# Altium integrated library LEMO Unipole And Multipole Type Connectors.IntLib: 1566 symbols (part 1 of 13)
Pins are listed as number, name and electrical type; pins without a type are passive.

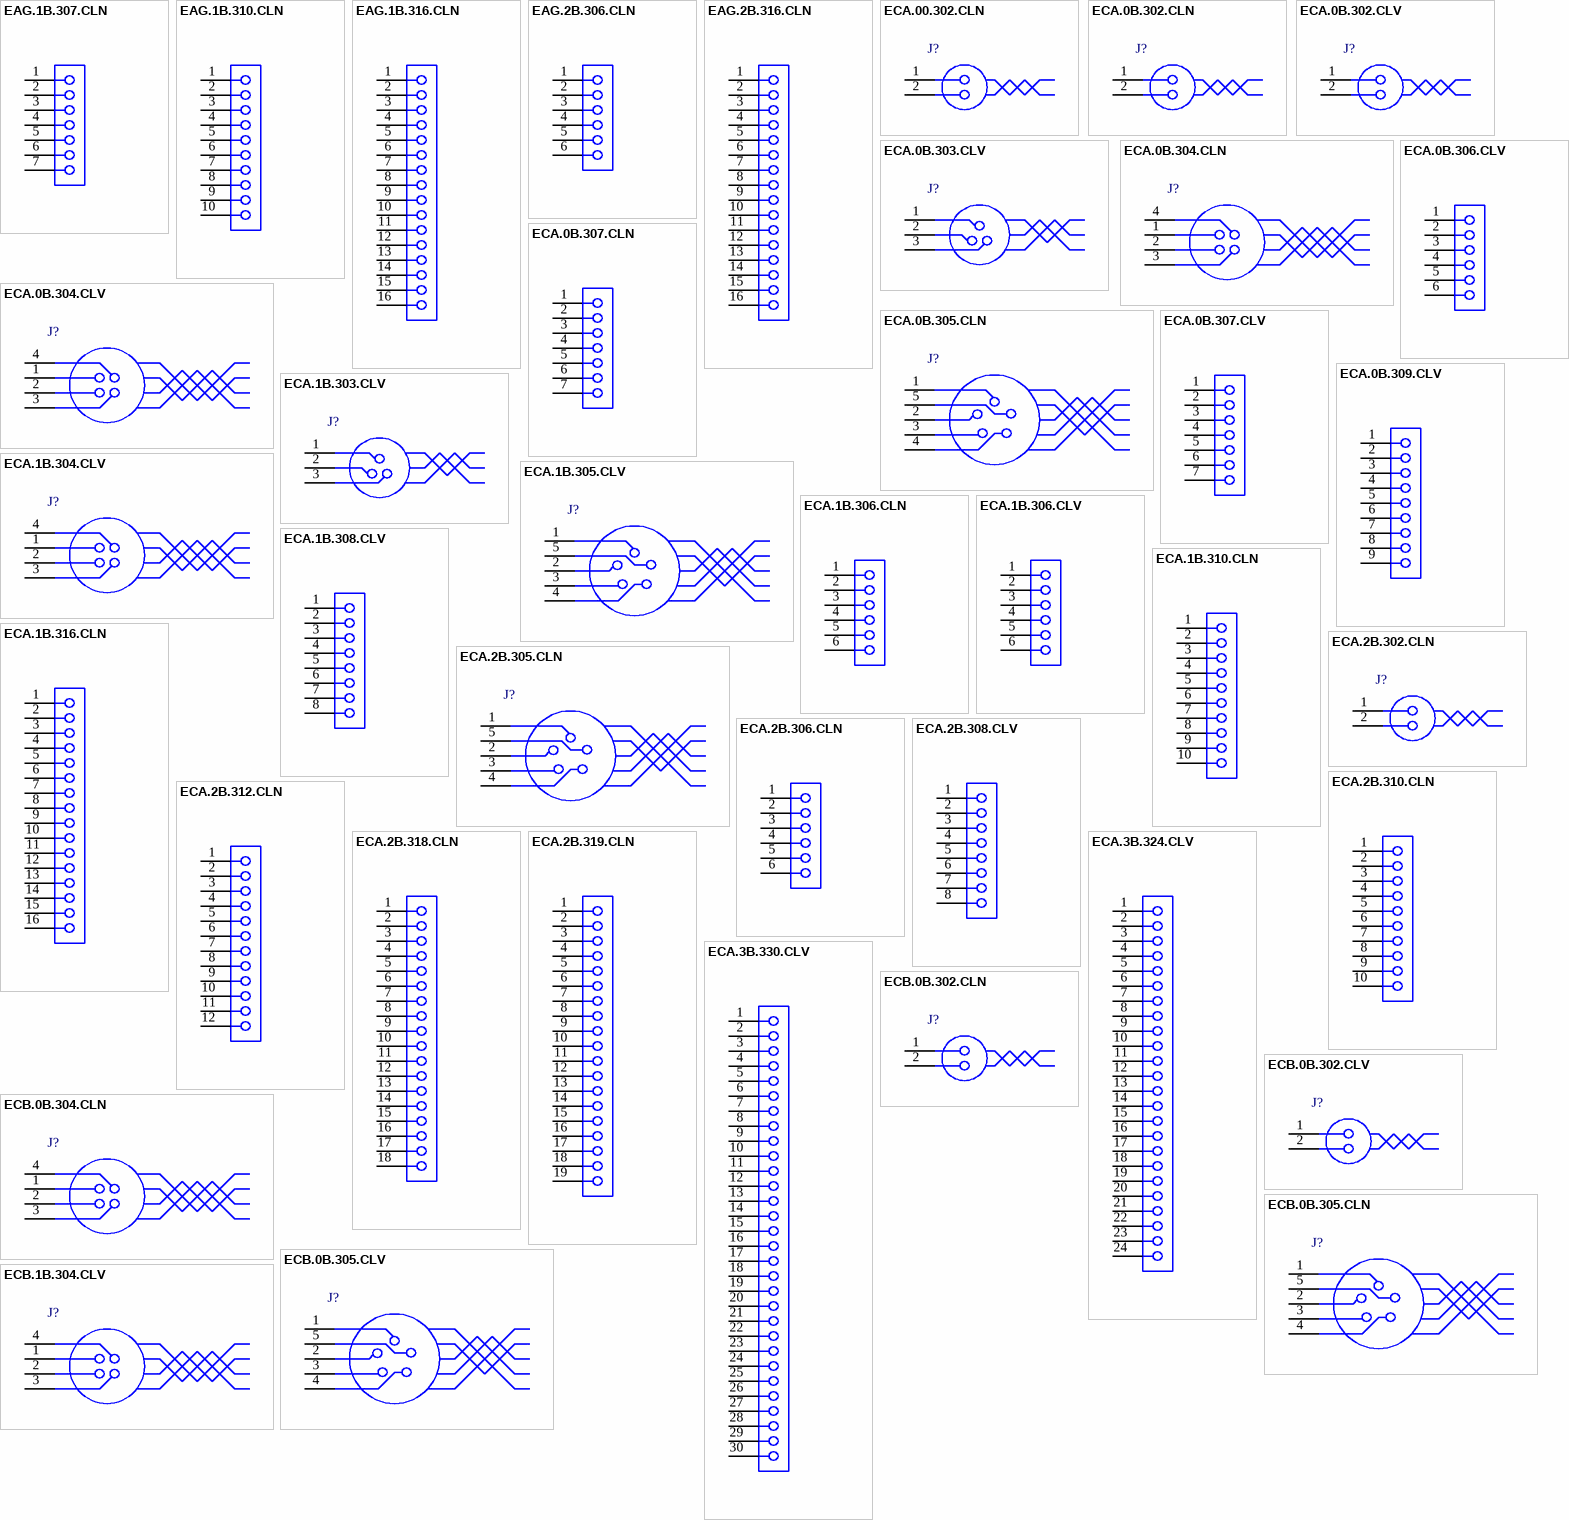
[diagram p0: symbols EAG.1B.307.CLN to ECB.1B.304.CLV]

## EAG.1B.307.CLN
designator J?
Fixed receptacle with one nuts (back panel mounting), Key (G), 1B series, Multipole Type with 7 Contacts; Manufacturer: LEMO; PartNumber: EAG.1B.307.CLN; Number of contacts: 7; Contact Diameter: 0.7 mm; AWG: 24; DatasheetVersion: Jun-14; PackageReference: EAG.1B.307.CLN; PackageDescription: Fixed receptacle with one nuts (back panel mounting), Key(G) for Printed Circuit; Rated Current(A): 7; ComponentLink1Description: Manufacturer URL; ComponentLink1URL: http://www.lemo.com; ComponentLink2Description: Datasheet; ComponentLink2URL: http://intra.lemo.ch/catalog/ROW/UK_English/unipole_multipole.pdf
footprint EAG.1B.307.CLN (Socket, Female, Through Hole)
pins: 1, 2, 3, 4, 5, 6, 7

## EAG.1B.310.CLN
designator J?
Fixed receptacle with one nuts (back panel mounting), Key (G), 1B series, Multipole Type with 10 Contacts; Manufacturer: LEMO; PartNumber: EAG.1B.310.CLN; Number of contacts: 10; Contact Diameter: 0.5 mm; AWG: 28; Rated Current(A): 2.5; DatasheetVersion: Jun-14; PackageReference: EAG.1B.310.CLN; PackageDescription: Fixed receptacle with one nuts (back panel mounting), Key(G) for Printed Circuit; ComponentLink1Description: Manufacturer URL; ComponentLink1URL: http://www.lemo.com; ComponentLink2Description: Datasheet; ComponentLink2URL: http://intra.lemo.ch/catalog/ROW/UK_English/unipole_multipole.pdf
footprint EAG.1B.310.CLN (Socket, Female, Through Hole)
pins: 1, 2, 3, 4, 5, 6, 7, 8, 9, 10

## EAG.1B.316.CLN
designator J?
Fixed receptacle with one nuts (back panel mounting), Key (G), 1B series, Multipole Type with 16 Contacts; Manufacturer: LEMO; PartNumber: EAG.1B.316.CLN; Number of contacts: 16; Contact Diameter: 0.5 mm; AWG: 28; Rated Current(A): 1.5; DatasheetVersion: Jun-14; PackageReference: EAG.1B.316.CLN; PackageDescription: Fixed receptacle with one nuts (back panel mounting), Key(G) for Printed Circuit; ComponentLink1Description: Manufacturer URL; ComponentLink1URL: http://www.lemo.com; ComponentLink2Description: Datasheet; ComponentLink2URL: http://intra.lemo.ch/catalog/ROW/UK_English/unipole_multipole.pdf
footprint EAG.1B.316.CLN (Socket, Female, Through Hole)
pins: 1, 2, 3, 4, 5, 6, 7, 8, 9, 10, 11, 12, 13, 14, 15, 16

## EAG.2B.306.CLN
designator J?
Fixed receptacle with one nuts (back panel mounting), Key (G), 2B series, Multipole Type with 6 Contacts; Manufacturer: LEMO; PartNumber: EAG.2B.306.CLN; Number of contacts: 6; Contact Diameter: 1.3 mm; AWG: 20; Rated Current(A): 12; DatasheetVersion: Jun-14; PackageReference: EAG.2B.306.CLN; PackageDescription: Fixed receptacle with one nuts (back panel mounting), Key(G) for Printed Circuit; ComponentLink1Description: Manufacturer URL; ComponentLink1URL: http://www.lemo.com; ComponentLink2Description: Datasheet; ComponentLink2URL: http://intra.lemo.ch/catalog/ROW/UK_English/unipole_multipole.pdf
footprint EAG.2B.306.CLN (Socket, Female, Through Hole)
pins: 1, 2, 3, 4, 5, 6

## EAG.2B.316.CLN
designator J?
Fixed receptacle with one nuts (back panel mounting), Key (G), 2B series, Multipole Type with 16 Contacts; Manufacturer: LEMO; PartNumber: EAG.2B.316.CLN; Number of contacts: 16; Contact Diameter: 0.7 mm; AWG: 24; Rated Current(A): 6; DatasheetVersion: Jun-14; PackageReference: EAG.2B.316.CLN; PackageDescription: Fixed receptacle with one nuts (back panel mounting), Key(G) for Printed Circuit; ComponentLink1Description: Manufacturer URL; ComponentLink1URL: http://www.lemo.com; ComponentLink2Description: Datasheet; ComponentLink2URL: http://intra.lemo.ch/catalog/ROW/UK_English/unipole_multipole.pdf
footprint EAG.2B.316.CLN (Socket, Female, Through Hole)
pins: 1, 2, 3, 4, 5, 6, 7, 8, 9, 10, 11, 12, 13, 14, 15, 16

## ECA.00.302.CLN
designator J?
Fixed receptacle with two nuts and straight contact for printed circuit (back panel mounting), Key (A), 00 series, Multipole Type with 2 Contacts; Manufacturer: LEMO; PartNumber: ECA.00.302.CLN; Number of contacts: 2; Contact Diameter: 0.5 mm; AWG: 28; Rated Current(A): 5; DatasheetVersion: Jun-14; PackageReference: ECA.00.302.CLN; PackageDescription: Fixed receptacle with two nuts and straight contact for printed circuit (back panel mounting), Key(A) for Printed Circuit; Supplier 1: Mouser; Supplier Part Number 1: N/A; ComponentLink1Description: Manufacturer URL; ComponentLink1URL: http://www.lemo.com; ComponentLink2Description: Datasheet; ComponentLink2URL: http://intra.lemo.ch/catalog/ROW/UK_English/unipole_multipole.pdf
footprint ECA.00.302.CLN (Socket, Female, Through Hole)
pins: 1, 2

## ECA.0B.302.CLN
designator J?
Fixed receptacle with two nuts and straight contact for printed circuit (back panel mounting), Key (A), 0B series, Multipole Type with 2 Contacts; Manufacturer: LEMO; PartNumber: ECA.0B.302.CLN; Number of contacts: 2; Contact Diameter: 0.9 mm; AWG: 22; Rated Current(A): 10; DatasheetVersion: Jun-14; PackageReference: ECA.0B.302.CLN; PackageDescription: Fixed receptacle with two nuts and straight contact for printed circuit (back panel mounting), Key(A) for Printed Circuit; ComponentLink1Description: Manufacturer URL; ComponentLink1URL: http://www.lemo.com; ComponentLink2Description: Datasheet; ComponentLink2URL: http://intra.lemo.ch/catalog/ROW/UK_English/unipole_multipole.pdf
footprint ECA.0B.302.CLN (Socket, Female, Body 9mm dia. Height 16.4 mm, Through hole)
pins: 1, 2

## ECA.0B.302.CLV
designator J?
Fixed receptacle with two nuts, with elbow contact for printed circuit (back panel mounting), Key (A), 0B series, Multipole Type with 2 Contacts; Manufacturer: LEMO; PartNumber: ECA.0B.302.CLV; Number of contacts: 2; Contact Diameter: 0.9 mm; AWG: 22; Rated Current(A): 6; DatasheetVersion: Jun-14; PackageReference: ECA.0B.302.CLV; PackageDescription: Fixed receptacle with two nuts, with elbow contact for printed circuit (back panel mounting), Key(A) for Printed Circuit; ComponentLink1Description: Manufacturer URL; ComponentLink1URL: http://www.lemo.com; ComponentLink2Description: Datasheet; ComponentLink2URL: http://intra.lemo.ch/catalog/ROW/UK_English/unipole_multipole.pdf
footprint ECA.0B.302.CLV (Socket, Female, Body 9mm dia. Height 18.3 mm, Through hole)
pins: 1, 2

## ECA.0B.303.CLV
designator J?
Fixed receptacle with two nuts, with elbow contact for printed circuit (back panel mounting), Key (A), 0B series, Multipole Type with 3 Contacts; Manufacturer: LEMO; PartNumber: ECA.0B.303.CLV; Number of contacts: 3; Contact Diameter: 0.9 mm; AWG: 22; Rated Current(A): 6; DatasheetVersion: Jun-14; PackageReference: ECA.0B.303.CLV; PackageDescription: Fixed receptacle with two nuts, with elbow contact for printed circuit (back panel mounting), Key(A) for Printed Circuit; ComponentLink1Description: Manufacturer URL; ComponentLink1URL: http://www.lemo.com; ComponentLink2Description: Datasheet; ComponentLink2URL: http://intra.lemo.ch/catalog/ROW/UK_English/unipole_multipole.pdf
footprint ECA.0B.303.CLV (Socket, Female, Body 9mm dia. Height 18.3 mm, Through hole)
pins: 1, 2, 3

## ECA.0B.304.CLN
designator J?
Fixed receptacle with two nuts and straight contact for printed circuit (back panel mounting), Key (A), 0B series, Multipole Type with 4 Contacts; Manufacturer: LEMO; PartNumber: ECA.0B.304.CLN; Number of contacts: 4; Contact Diameter: 0.7 mm; AWG: 24; Rated Current(A): 7; DatasheetVersion: Jun-14; PackageReference: ECA.0B.304.CLN; PackageDescription: Fixed receptacle with two nuts and straight contact for printed circuit (back panel mounting), Key(A) for Printed Circuit; ComponentLink1Description: Manufacturer URL; ComponentLink1URL: http://www.lemo.com; ComponentLink2Description: Datasheet; ComponentLink2URL: http://intra.lemo.ch/catalog/ROW/UK_English/unipole_multipole.pdf
footprint ECA.0B.304.CLN (Socket, Female, Body 9mm dia. Height 16.4 mm, Through hole)
pins: 1, 2, 3, 4

## ECA.0B.304.CLV
designator J?
Fixed receptacle with two nuts, with elbow contact for printed circuit (back panel mounting), Key (A), 0B series, Multipole Type with 4 Contacts; Manufacturer: LEMO; PartNumber: ECA.0B.304.CLV; Number of contacts: 4; Contact Diameter: 0.7 mm; AWG: 24; Rated Current(A): 6; DatasheetVersion: Jun-14; PackageReference: ECA.0B.304.CLV; PackageDescription: Fixed receptacle with two nuts, with elbow contact for printed circuit (back panel mounting), Key(A) for Printed Circuit; Supplier 1: Mouser; Supplier Part Number 1: 736-ECA0B304CLV; Supplier 2: Digi-Key; Supplier Part Number 2: ECA.0B.304.CLV-ND; ComponentLink1Description: Manufacturer URL; ComponentLink1URL: http://www.lemo.com; ComponentLink2Description: Datasheet; ComponentLink2URL: http://intra.lemo.ch/catalog/ROW/UK_English/unipole_multipole.pdf
footprint ECA.0B.304.CLV (Socket, Female, Body 9mm dia. Height 18.3 mm, Through hole)
pins: 1, 2, 3, 4

## ECA.0B.305.CLN
designator J?
Fixed receptacle with two nuts and straight contact for printed circuit (back panel mounting), Key (A), 0B series, Multipole Type with 5 Contacts; Manufacturer: LEMO; PartNumber: ECA.0B.305.CLN; Number of contacts: 5; Contact Diameter: 0.7 mm; AWG: 24; Rated Current(A): 6.5; DatasheetVersion: Jun-14; PackageReference: ECA.0B.305.CLN; PackageDescription: Fixed receptacle with two nuts and straight contact for printed circuit (back panel mounting), Key(A) for Printed Circuit; Supplier 1: Mouser; Supplier Part Number 1: 736-ECA0B305CLN; Supplier 2: Newark; Supplier Part Number 2: 29Y5664; Supplier 3: Digi-Key; Supplier Part Number 3: ECA.0B.305.CLN-ND; ComponentLink1Description: Manufacturer URL; ComponentLink1URL: http://www.lemo.com; ComponentLink2Description: Datasheet; ComponentLink2URL: http://intra.lemo.ch/catalog/ROW/UK_English/unipole_multipole.pdf
footprint ECA.0B.305.CLN (Socket, Female, Body 9mm dia. Height 16.4 mm, Through hole)
pins: 1, 2, 3, 4, 5

## ECA.0B.306.CLV
designator J?
Fixed receptacle with two nuts, with elbow contact for printed circuit (back panel mounting), Key (A), 0B series, Multipole Type with 6 Contacts; Manufacturer: LEMO; PartNumber: ECA.0B.306.CLV; Number of contacts: 6; Contact Diameter: 0.5 mm; AWG: 28; Rated Current(A): 0; DatasheetVersion: Jun-14; PackageReference: ECA.0B.306.CLV; PackageDescription: Fixed receptacle with two nuts, with elbow contact for printed circuit (back panel mounting), Key(A) for Printed Circuit; ComponentLink1Description: Manufacturer URL; ComponentLink1URL: http://www.lemo.com; ComponentLink2Description: Datasheet; ComponentLink2URL: http://intra.lemo.ch/catalog/ROW/UK_English/unipole_multipole.pdf
footprint ECA.0B.306.CLV (Socket, Female, Body 9mm dia. Height 18.3 mm, Through hole)
pins: 1, 2, 3, 4, 5, 6

## ECA.0B.307.CLN
designator J?
Fixed receptacle with two nuts and straight contact for printed circuit (back panel mounting), Key (A), 0B series, Multipole Type with 7 Contacts; Manufacturer: LEMO; PartNumber: ECA.0B.307.CLN; Number of contacts: 7; Contact Diameter: 0.5 mm; AWG: 28; Rated Current(A): 2.5; DatasheetVersion: Jun-14; PackageReference: ECA.0B.307.CLN; PackageDescription: Fixed receptacle with two nuts and straight contact for printed circuit (back panel mounting), Key(A) for Printed Circuit; ComponentLink1Description: Manufacturer URL; ComponentLink1URL: http://www.lemo.com; ComponentLink2Description: Datasheet; ComponentLink2URL: http://intra.lemo.ch/catalog/ROW/UK_English/unipole_multipole.pdf
footprint ECA.0B.307.CLN (Socket, Female, Body 9mm dia. Height 16.4 mm, Through hole)
pins: 1, 2, 3, 4, 5, 6, 7

## ECA.0B.307.CLV
designator J?
Fixed receptacle with two nuts, with elbow contact for printed circuit (back panel mounting), Key (A), 0B series, Multipole Type with 7 Contacts; Manufacturer: LEMO; PartNumber: ECA.0B.307.CLV; Number of contacts: 7; Contact Diameter: 0.5 mm; AWG: 28; Rated Current(A): 0; DatasheetVersion: Jun-14; PackageReference: ECA.0B.307.CLV; PackageDescription: Fixed receptacle with two nuts, with elbow contact for printed circuit (back panel mounting), Key(A) for Printed Circuit; ComponentLink1Description: Manufacturer URL; ComponentLink1URL: http://www.lemo.com; ComponentLink2Description: Datasheet; ComponentLink2URL: http://intra.lemo.ch/catalog/ROW/UK_English/unipole_multipole.pdf
footprint ECA.0B.307.CLV (Socket, Female, Body 9mm dia. Height 18.3 mm, Through hole)
pins: 1, 2, 3, 4, 5, 6, 7

## ECA.0B.309.CLV
designator J?
Fixed receptacle with two nuts, with elbow contact for printed circuit (back panel mounting), Key (A), 0B series, Multipole Type with 9 Contacts; Manufacturer: LEMO; PartNumber: ECA.0B.309.CLV; Number of contacts: 9; Contact Diameter: 0.5 mm; AWG: 28; Rated Current(A): 0; DatasheetVersion: Jun-14; PackageReference: ECA.0B.309.CLV; PackageDescription: Fixed receptacle with two nuts, with elbow contact for printed circuit (back panel mounting), Key(A) for Printed Circuit; ComponentLink1Description: Manufacturer URL; ComponentLink1URL: http://www.lemo.com; ComponentLink2Description: Datasheet; ComponentLink2URL: http://intra.lemo.ch/catalog/ROW/UK_English/unipole_multipole.pdf
footprint ECA.0B.309.CLV (Socket, Female, Body 9mm dia. Height 18.3 mm, Through hole)
pins: 1, 2, 3, 4, 5, 6, 7, 8, 9

## ECA.1B.303.CLV
designator J?
Fixed receptacle with two nuts, with elbow contact for printed circuit (back panel mounting), Key (A), 1B series, Multipole Type with 3 Contacts; Manufacturer: LEMO; PartNumber: ECA.1B.303.CLV; Number of contacts: 3; Contact Diameter: 1.3 mm; AWG: 20; Rated Current(A): 0; DatasheetVersion: Jun-14; PackageReference: ECA.1B.303.CLV; PackageDescription: Fixed receptacle with two nuts, with elbow contact for printed circuit (back panel mounting), Key(A) for Printed Circuit; ComponentLink1Description: Manufacturer URL; ComponentLink1URL: http://www.lemo.com; ComponentLink2Description: Datasheet; ComponentLink2URL: http://intra.lemo.ch/catalog/ROW/UK_English/unipole_multipole.pdf
footprint ECA.1B.303.CLV (Socket, Female, Body 12mm dia. Height 20.3 mm, Through hole)
pins: 1, 2, 3

## ECA.1B.304.CLV
designator J?
Fixed receptacle with two nuts, with elbow contact for printed circuit (back panel mounting), Key (A), 1B series, Multipole Type with 4 Contacts; Manufacturer: LEMO; PartNumber: ECA.1B.304.CLV; Number of contacts: 4; Contact Diameter: 0.9 mm; AWG: 22; Rated Current(A): 6; DatasheetVersion: Jun-14; PackageReference: ECA.1B.304.CLV; PackageDescription: Fixed receptacle with two nuts, with elbow contact for printed circuit (back panel mounting), Key(A) for Printed Circuit; ComponentLink1Description: Manufacturer URL; ComponentLink1URL: http://www.lemo.com; ComponentLink2Description: Datasheet; ComponentLink2URL: http://intra.lemo.ch/catalog/ROW/UK_English/unipole_multipole.pdf
footprint ECA.1B.304.CLV (Socket, Female, Body 12mm dia. Height 20.3 mm, Through hole)
pins: 1, 2, 3, 4

## ECA.1B.305.CLV
designator J?
Fixed receptacle with two nuts, with elbow contact for printed circuit (back panel mounting), Key (A), 1B series, Multipole Type with 5 Contacts; Manufacturer: LEMO; PartNumber: ECA.1B.305.CLV; Number of contacts: 5; Contact Diameter: 0.9 mm; AWG: 22; Rated Current(A): 6; DatasheetVersion: Jun-14; PackageReference: ECA.1B.305.CLV; PackageDescription: Fixed receptacle with two nuts, with elbow contact for printed circuit (back panel mounting), Key(A) for Printed Circuit; ComponentLink1Description: Manufacturer URL; ComponentLink1URL: http://www.lemo.com; ComponentLink2Description: Datasheet; ComponentLink2URL: http://intra.lemo.ch/catalog/ROW/UK_English/unipole_multipole.pdf
footprint ECA.1B.305.CLV (Socket, Female, Body 12mm dia. Height 20.3 mm, Through hole)
pins: 1, 2, 3, 4, 5

## ECA.1B.306.CLN
designator J?
Fixed receptacle with two nuts and straight contact for printed circuit (back panel mounting), Key (A), 1B series, Multipole Type with 6 Contacts; Manufacturer: LEMO; PartNumber: ECA.1B.306.CLN; Number of contacts: 6; Contact Diameter: 0.7 mm; AWG: 24; Rated Current(A): 7; DatasheetVersion: Jun-14; PackageReference: ECA.1B.306.CLN; PackageDescription: Fixed receptacle with two nuts and straight contact for printed circuit (back panel mounting), Key(A) for Printed Circuit; ComponentLink1Description: Manufacturer URL; ComponentLink1URL: http://www.lemo.com; ComponentLink2Description: Datasheet; ComponentLink2URL: http://intra.lemo.ch/catalog/ROW/UK_English/unipole_multipole.pdf
footprint ECA.1B.306.CLN (Socket, Female, Body 12mm dia. Height 19.8 mm, Through hole)
pins: 1, 2, 3, 4, 5, 6

## ECA.1B.306.CLV
designator J?
Fixed receptacle with two nuts, with elbow contact for printed circuit (back panel mounting), Key (A), 1B series, Multipole Type with 6 Contacts; Manufacturer: LEMO; PartNumber: ECA.1B.306.CLV; Number of contacts: 6; Contact Diameter: 0.7 mm; AWG: 24; DatasheetVersion: Jun-14; PackageReference: ECA.1B.306.CLV; PackageDescription: Fixed receptacle with two nuts, with elbow contact for printed circuit (back panel mounting), Key(A) for Printed Circuit; Rated Current(A): 6; ComponentLink1Description: Manufacturer URL; ComponentLink1URL: http://www.lemo.com; ComponentLink2Description: Datasheet; ComponentLink2URL: http://intra.lemo.ch/catalog/ROW/UK_English/unipole_multipole.pdf
footprint ECA.1B.306.CLV (Socket, Female, Body 12mm dia. Height 20.3 mm, Through hole)
pins: 1, 2, 3, 4, 5, 6

## ECA.1B.308.CLV
designator J?
Fixed receptacle with two nuts, with elbow contact for printed circuit (back panel mounting), Key (A), 1B series, Multipole Type with 8 Contacts; Manufacturer: LEMO; PartNumber: ECA.1B.308.CLV; Number of contacts: 8; Contact Diameter: 0.7 mm; AWG: 24; Rated Current(A): 0; DatasheetVersion: Jun-14; PackageReference: ECA.1B.308.CLV; PackageDescription: Fixed receptacle with two nuts, with elbow contact for printed circuit (back panel mounting), Key(A) for Printed Circuit; ComponentLink1Description: Manufacturer URL; ComponentLink1URL: http://www.lemo.com; ComponentLink2Description: Datasheet; ComponentLink2URL: http://intra.lemo.ch/catalog/ROW/UK_English/unipole_multipole.pdf
footprint ECA.1B.308.CLV (Socket, Female, Body 12mm dia. Height 20.3 mm, Through hole)
pins: 1, 2, 3, 4, 5, 6, 7, 8

## ECA.1B.310.CLN
designator J?
Fixed receptacle with two nuts and straight contact for printed circuit (back panel mounting), Key (A), 1B series, Multipole Type with 10 Contacts; Manufacturer: LEMO; PartNumber: ECA.1B.310.CLN; Number of contacts: 10; Contact Diameter: 0.5 mm; AWG: 28; Rated Current(A): 2.5; DatasheetVersion: Jun-14; PackageReference: ECA.1B.310.CLN; PackageDescription: Fixed receptacle with two nuts and straight contact for printed circuit (back panel mounting), Key(A) for Printed Circuit; Supplier 1: Mouser; Supplier Part Number 1: 736-ECA1B310CLN; Supplier 2: Digi-Key; Supplier Part Number 2: ECA.1B.310.CLN-ND; ComponentLink1Description: Manufacturer URL; ComponentLink1URL: http://www.lemo.com; ComponentLink2Description: Datasheet; ComponentLink2URL: http://intra.lemo.ch/catalog/ROW/UK_English/unipole_multipole.pdf
footprint ECA.1B.310.CLN (Socket, Female, Body 12mm dia. Height 19.8 mm, Through hole)
pins: 1, 2, 3, 4, 5, 6, 7, 8, 9, 10

## ECA.1B.316.CLN
designator J?
Fixed receptacle with two nuts and straight contact for printed circuit (back panel mounting), Key (A), 1B series, Multipole Type with 16 Contacts; Manufacturer: LEMO; PartNumber: ECA.1B.316.CLN; Number of contacts: 16; Contact Diameter: 0.5 mm; AWG: 28; Rated Current(A): 1.5; DatasheetVersion: Jun-14; PackageReference: ECA.1B.316.CLN; PackageDescription: Fixed receptacle with two nuts and straight contact for printed circuit (back panel mounting), Key(A) for Printed Circuit; ComponentLink1Description: Manufacturer URL; ComponentLink1URL: http://www.lemo.com; ComponentLink2Description: Datasheet; ComponentLink2URL: http://intra.lemo.ch/catalog/ROW/UK_English/unipole_multipole.pdf
footprint ECA.1B.316.CLN (Socket, Female, Body 12mm dia. Height 19.8 mm, Through hole)
pins: 1, 2, 3, 4, 5, 6, 7, 8, 9, 10, 11, 12, 13, 14, 15, 16

## ECA.2B.302.CLN
designator J?
Fixed receptacle with two nuts and straight contact for printed circuit (back panel mounting), Key (A), 2B series, Multipole Type with 2 Contacts; Manufacturer: LEMO; PartNumber: ECA.2B.302.CLN; Number of contacts: 2; Contact Diameter: 2 mm; AWG: 14; Rated Current(A): 25; DatasheetVersion: Jun-14; PackageReference: ECA.2B.302.CLN; PackageDescription: Fixed receptacle with two nuts and straight contact for printed circuit (back panel mounting), Key(A) for Printed Circuit; Supplier 1: Mouser; Supplier Part Number 1: 736-ECA2B302CLN; Supplier 2: Digi-Key; Supplier Part Number 2: ECA.2B.302.CLN-ND; ComponentLink1Description: Manufacturer URL; ComponentLink1URL: http://www.lemo.com; ComponentLink2Description: Datasheet; ComponentLink2URL: http://intra.lemo.ch/catalog/ROW/UK_English/unipole_multipole.pdf
footprint ECA.2B.302.CLN (Socket, Female, Body 15mm dia. Height 21.8 mm, Through hole)
pins: 1, 2

## ECA.2B.305.CLN
designator J?
Fixed receptacle with two nuts and straight contact for printed circuit (back panel mounting), Key (A), 2B series, Multipole Type with 5 Contacts; Manufacturer: LEMO; PartNumber: ECA.2B.305.CLN; Number of contacts: 5; Contact Diameter: 1.3 mm; AWG: 20; Rated Current(A): 14; DatasheetVersion: Jun-14; PackageReference: ECA.2B.305.CLN; PackageDescription: Fixed receptacle with two nuts and straight contact for printed circuit (back panel mounting), Key(A) for Printed Circuit; ComponentLink1Description: Manufacturer URL; ComponentLink1URL: http://www.lemo.com; ComponentLink2Description: Datasheet; ComponentLink2URL: http://intra.lemo.ch/catalog/ROW/UK_English/unipole_multipole.pdf
footprint ECA.2B.305.CLN (Socket, Female, Body 15mm dia. Height 21.8 mm, Through hole)
pins: 1, 2, 3, 4, 5

## ECA.2B.306.CLN
designator J?
Fixed receptacle with two nuts and straight contact for printed circuit (back panel mounting), Key (A), 2B series, Multipole Type with 6 Contacts; Manufacturer: LEMO; PartNumber: ECA.2B.306.CLN; Number of contacts: 6; Contact Diameter: 1.3 mm; AWG: 20; Rated Current(A): 12; DatasheetVersion: Jun-14; PackageReference: ECA.2B.306.CLN; PackageDescription: Fixed receptacle with two nuts and straight contact for printed circuit (back panel mounting), Key(A) for Printed Circuit; ComponentLink1Description: Manufacturer URL; ComponentLink1URL: http://www.lemo.com; ComponentLink2Description: Datasheet; ComponentLink2URL: http://intra.lemo.ch/catalog/ROW/UK_English/unipole_multipole.pdf
footprint ECA.2B.306.CLN (Socket, Female, Body 15mm dia. Height 21.8 mm, Through hole)
pins: 1, 2, 3, 4, 5, 6

## ECA.2B.308.CLV
designator J?
Fixed receptacle with two nuts, with elbow contact for printed circuit (back panel mounting), Key (A), 2B series, Multipole Type with 8 Contacts; Manufacturer: LEMO; PartNumber: ECA.2B.308.CLV; Number of contacts: 8; Contact Diameter: 0.9 mm; AWG: 22; Rated Current(A): 6; DatasheetVersion: Jun-14; PackageReference: ECA.2B.308.CLV; PackageDescription: Fixed receptacle with two nuts, with elbow contact for printed circuit (back panel mounting), Key(A) for Printed Circuit; ComponentLink1Description: Manufacturer URL; ComponentLink1URL: http://www.lemo.com; ComponentLink2Description: Datasheet; ComponentLink2URL: http://intra.lemo.ch/catalog/ROW/UK_English/unipole_multipole.pdf
footprint ECA.2B.308.CLV (Socket, Female, Body 15mm dia. Height 22.3 mm, Through hole)
pins: 1, 2, 3, 4, 5, 6, 7, 8

## ECA.2B.310.CLN
designator J?
Fixed receptacle with two nuts and straight contact for printed circuit (back panel mounting), Key (A), 2B series, Multipole Type with 10 Contacts; Manufacturer: LEMO; PartNumber: ECA.2B.310.CLN; Number of contacts: 10; Contact Diameter: 0.9 mm; AWG: 22; Rated Current(A): 8; DatasheetVersion: Jun-14; PackageReference: ECA.2B.310.CLN; PackageDescription: Fixed receptacle with two nuts and straight contact for printed circuit (back panel mounting), Key(A) for Printed Circuit; Supplier 1: Mouser; Supplier Part Number 1: 736-ECA2B310CLN; Supplier 2: Digi-Key; Supplier Part Number 2: ECA.2B.310.CLN-ND; ComponentLink1Description: Manufacturer URL; ComponentLink1URL: http://www.lemo.com; ComponentLink2Description: Datasheet; ComponentLink2URL: http://intra.lemo.ch/catalog/ROW/UK_English/unipole_multipole.pdf
footprint ECA.2B.310.CLN (Socket, Female, Body 15mm dia. Height 21.8 mm, Through hole)
pins: 1, 2, 3, 4, 5, 6, 7, 8, 9, 10

## ECA.2B.312.CLN
designator J?
Fixed receptacle with two nuts and straight contact for printed circuit (back panel mounting), Key (A), 2B series, Multipole Type with 12 Contacts; Manufacturer: LEMO; PartNumber: ECA.2B.312.CLN; Number of contacts: 12; Contact Diameter: 0.7 mm; AWG: 24; Rated Current(A): 7; DatasheetVersion: Jun-14; PackageReference: ECA.2B.312.CLN; PackageDescription: Fixed receptacle with two nuts and straight contact for printed circuit (back panel mounting), Key(A) for Printed Circuit; Supplier 1: Mouser; Supplier Part Number 1: 736-ECA2B312CLN; Supplier 2: Digi-Key; Supplier Part Number 2: ECA.2B.312.CLN-ND; ComponentLink1Description: Manufacturer URL; ComponentLink1URL: http://www.lemo.com; ComponentLink2Description: Datasheet; ComponentLink2URL: http://intra.lemo.ch/catalog/ROW/UK_English/unipole_multipole.pdf
footprint ECA.2B.312.CLN (Socket, Female, Body 15mm dia. Height 21.8 mm, Through hole)
pins: 1, 2, 3, 4, 5, 6, 7, 8, 9, 10, 11, 12

## ECA.2B.318.CLN
designator J?
Fixed receptacle with two nuts and straight contact for printed circuit (back panel mounting), Key (A), 2B series, Multipole Type with 18 Contacts; Manufacturer: LEMO; PartNumber: ECA.2B.318.CLN; Number of contacts: 18; Contact Diameter: 0.7 mm; AWG: 24; Rated Current(A): 5.5; DatasheetVersion: Jun-14; PackageReference: ECA.2B.318.CLN; PackageDescription: Fixed receptacle with two nuts and straight contact for printed circuit (back panel mounting), Key(A) for Printed Circuit; Supplier 1: Mouser; Supplier Part Number 1: 736-ECA.2B.318.CLN; Supplier 2: Digi-Key; Supplier Part Number 2: ECA.2B.318.CLN-ND; ComponentLink1Description: Manufacturer URL; ComponentLink1URL: http://www.lemo.com; ComponentLink2Description: Datasheet; ComponentLink2URL: http://intra.lemo.ch/catalog/ROW/UK_English/unipole_multipole.pdf
footprint ECA.2B.318.CLN (Socket, Female, Body 15mm dia. Height 21.8 mm, Through hole)
pins: 1, 2, 3, 4, 5, 6, 7, 8, 9, 10, 11, 12, 13, 14, 15, 16, 17, 18

## ECA.2B.319.CLN
designator J?
Fixed receptacle with two nuts and straight contact for printed circuit (back panel mounting), Key (A), 2B series, Multipole Type with 19 Contacts; Manufacturer: LEMO; PartNumber: ECA.2B.319.CLN; Number of contacts: 19; Contact Diameter: 0.7 mm; AWG: 24; Rated Current(A): 5; DatasheetVersion: Jun-14; PackageReference: ECA.2B.319.CLN; PackageDescription: Fixed receptacle with two nuts and straight contact for printed circuit (back panel mounting), Key(A) for Printed Circuit; Supplier 1: Mouser; Supplier Part Number 1: 736-ECA2B319CLN; Supplier 2: Digi-Key; Supplier Part Number 2: ECA.2B.319.CLN-ND; ComponentLink1Description: Manufacturer URL; ComponentLink1URL: http://www.lemo.com; ComponentLink2Description: Datasheet; ComponentLink2URL: http://intra.lemo.ch/catalog/ROW/UK_English/unipole_multipole.pdf
footprint ECA.2B.319.CLN (Socket, Female, Body 15mm dia. Height 21.8 mm, Through hole)
pins: 1, 2, 3, 4, 5, 6, 7, 8, 9, 10, 11, 12, 13, 14, 15, 16, 17, 18, 19

## ECA.3B.324.CLV
designator J?
Fixed receptacle with two nuts, with elbow contact for printed circuit (back panel mounting), Key (A), 3B series, Multipole Type with 24 Contacts; Manufacturer: LEMO; PartNumber: ECA.3B.324.CLV; Number of contacts: 24; Contact Diameter: 0.7 mm; Rated Current(A): 0; DatasheetVersion: Jun-14; PackageReference: ECA.3B.324.CLV; PackageDescription: Fixed receptacle with two nuts, with elbow contact for printed circuit (back panel mounting), Key(A) for Printed Circuit; AWG: 24; ComponentLink1Description: Manufacturer URL; ComponentLink1URL: http://www.lemo.com; ComponentLink2Description: Datasheet; ComponentLink2URL: http://intra.lemo.ch/catalog/ROW/UK_English/unipole_multipole.pdf
footprint ECA.3B.324.CLV (Socket, Female, Body 18mm dia. Height 25.8 mm, Through hole)
pins: 1, 2, 3, 4, 5, 6, 7, 8, 9, 10, 11, 12, 13, 14, 15, 16, 17, 18, 19, 20, 21, 22, 23, 24

## ECA.3B.330.CLV
designator J?
Fixed receptacle with two nuts, with elbow contact for printed circuit (back panel mounting), Key (A), 3B series, Multipole Type with 30 Contacts; Manufacturer: LEMO; PartNumber: ECA.3B.330.CLV; Number of contacts: 30; Contact Diameter: 0.7 mm; AWG: 24; Rated Current(A): 0; DatasheetVersion: Jun-14; PackageReference: ECA.3B.330.CLV; PackageDescription: Fixed receptacle with two nuts, with elbow contact for printed circuit (back panel mounting), Key(A) for Printed Circuit; ComponentLink1Description: Manufacturer URL; ComponentLink1URL: http://www.lemo.com; ComponentLink2Description: Datasheet; ComponentLink2URL: http://intra.lemo.ch/catalog/ROW/UK_English/unipole_multipole.pdf
footprint ECA.3B.330.CLV (Socket, Female, Body 18mm dia. Height 25.8 mm, Through hole)
pins: 1, 2, 3, 4, 5, 6, 7, 8, 9, 10, 11, 12, 13, 14, 15, 16, 17, 18, 19, 20, 21, 22, 23, 24, 25, 26, 27, 28, 29, 30

## ECB.0B.302.CLN
designator J?
Fixed receptacle with two nuts and straight contact for printed circuit (back panel mounting), Key (B), 0B series, Multipole Type with 2 Contacts; Manufacturer: LEMO; PartNumber: ECB.0B.302.CLN; Number of contacts: 2; Contact Diameter: 0.9 mm; AWG: 22; Rated Current(A): 10; DatasheetVersion: Jun-14; PackageReference: ECB.0B.302.CLN; PackageDescription: Fixed receptacle with two nuts and straight contact for printed circuit (back panel mounting), Key(B) for Printed Circuit; Supplier 1: Mouser; Supplier Part Number 1: 736-ECB0B302CLN; Supplier 2: Digi-Key; Supplier Part Number 2: ECB.0B.302.CLN-ND; ComponentLink1Description: Manufacturer URL; ComponentLink1URL: http://www.lemo.com; ComponentLink2Description: Datasheet; ComponentLink2URL: http://intra.lemo.ch/catalog/ROW/UK_English/unipole_multipole.pdf
footprint ECB.0B.302.CLN (Socket, Female, Body 9mm dia. Height 16.4 mm, Through hole)
pins: 1, 2

## ECB.0B.302.CLV
designator J?
Fixed receptacle with two nuts, with elbow contact for printed circuit (back panel mounting), Key (B), 0B series, Multipole Type with 2 Contacts; Manufacturer: LEMO; PartNumber: ECB.0B.302.CLV; Number of contacts: 2; Contact Diameter: 0.9 mm; AWG: 22; Rated Current(A): 6; DatasheetVersion: Jun-14; PackageReference: ECB.0B.302.CLV; PackageDescription: Fixed receptacle with two nuts, with elbow contact for printed circuit (back panel mounting), Key(B) for Printed Circuit; ComponentLink1Description: Manufacturer URL; ComponentLink1URL: http://www.lemo.com; ComponentLink2Description: Datasheet; ComponentLink2URL: http://intra.lemo.ch/catalog/ROW/UK_English/unipole_multipole.pdf
footprint ECB.0B.302.CLV (Socket, Female, Body 9mm dia. Height 18.3 mm, Through hole)
pins: 1, 2

## ECB.0B.304.CLN
designator J?
Fixed receptacle with two nuts and straight contact for printed circuit (back panel mounting), Key (B), 0B series, Multipole Type with 4 Contacts; Manufacturer: LEMO; PartNumber: ECB.0B.304.CLN; Number of contacts: 4; Contact Diameter: 0.7 mm; AWG: 24; Rated Current(A): 7; DatasheetVersion: Jun-14; PackageReference: ECB.0B.304.CLN; PackageDescription: Fixed receptacle with two nuts and straight contact for printed circuit (back panel mounting), Key(B) for Printed Circuit; Supplier 1: Mouser; Supplier Part Number 1: 736-ECB0B304CLN; Supplier 2: Digi-Key; Supplier Part Number 2: ECB.0B.304.CLN-ND; ComponentLink1Description: Manufacturer URL; ComponentLink1URL: http://www.lemo.com; ComponentLink2Description: Datasheet; ComponentLink2URL: http://intra.lemo.ch/catalog/ROW/UK_English/unipole_multipole.pdf
footprint ECB.0B.304.CLN (Socket, Female, Body 9mm dia. Height 16.4 mm, Through hole)
pins: 1, 2, 3, 4

## ECB.0B.305.CLN
designator J?
Fixed receptacle with two nuts and straight contact for printed circuit (back panel mounting), Key (B), 0B series, Multipole Type with 5 Contacts; Manufacturer: LEMO; PartNumber: ECB.0B.305.CLN; Number of contacts: 5; Contact Diameter: 0.7 mm; AWG: 24; Rated Current(A): 6.5; DatasheetVersion: Jun-14; PackageReference: ECB.0B.305.CLN; PackageDescription: Fixed receptacle with two nuts and straight contact for printed circuit (back panel mounting), Key(B) for Printed Circuit; Supplier 1: Mouser; Supplier Part Number 1: N/A; ComponentLink1Description: Manufacturer URL; ComponentLink1URL: http://www.lemo.com; ComponentLink2Description: Datasheet; ComponentLink2URL: http://intra.lemo.ch/catalog/ROW/UK_English/unipole_multipole.pdf
footprint ECB.0B.305.CLN (Socket, Female, Body 9mm dia. Height 16.4 mm, Through hole)
pins: 1, 2, 3, 4, 5

## ECB.0B.305.CLV
designator J?
Fixed receptacle with two nuts, with elbow contact for printed circuit (back panel mounting), Key (B), 0B series, Multipole Type with 5 Contacts; Manufacturer: LEMO; PartNumber: ECB.0B.305.CLV; Number of contacts: 5; Contact Diameter: 0.7 mm; AWG: 24; Rated Current(A): 6; DatasheetVersion: Jun-14; PackageReference: ECB.0B.305.CLV; PackageDescription: Fixed receptacle with two nuts, with elbow contact for printed circuit (back panel mounting), Key(B) for Printed Circuit; ComponentLink1Description: Manufacturer URL; ComponentLink1URL: http://www.lemo.com; ComponentLink2Description: Datasheet; ComponentLink2URL: http://intra.lemo.ch/catalog/ROW/UK_English/unipole_multipole.pdf
footprint ECB.0B.305.CLV (Socket, Female, Body 9mm dia. Height 18.3 mm, Through hole)
pins: 1, 2, 3, 4, 5

## ECB.1B.304.CLV
designator J?
Fixed receptacle with two nuts, with elbow contact for printed circuit (back panel mounting), Key (B), 1B series, Multipole Type with 4 Contacts; Manufacturer: LEMO; PartNumber: ECB.1B.304.CLV; Number of contacts: 4; Contact Diameter: 0.9 mm; AWG: 22; Rated Current(A): 6; DatasheetVersion: Jun-14; PackageReference: ECB.1B.304.CLV; PackageDescription: Fixed receptacle with two nuts, with elbow contact for printed circuit (back panel mounting), Key(B) for Printed Circuit; ComponentLink1Description: Manufacturer URL; ComponentLink1URL: http://www.lemo.com; ComponentLink2Description: Datasheet; ComponentLink2URL: http://intra.lemo.ch/catalog/ROW/UK_English/unipole_multipole.pdf
footprint ECB.1B.304.CLV (Socket, Female, Body 12mm dia. Height 20.3 mm, Through hole)
pins: 1, 2, 3, 4

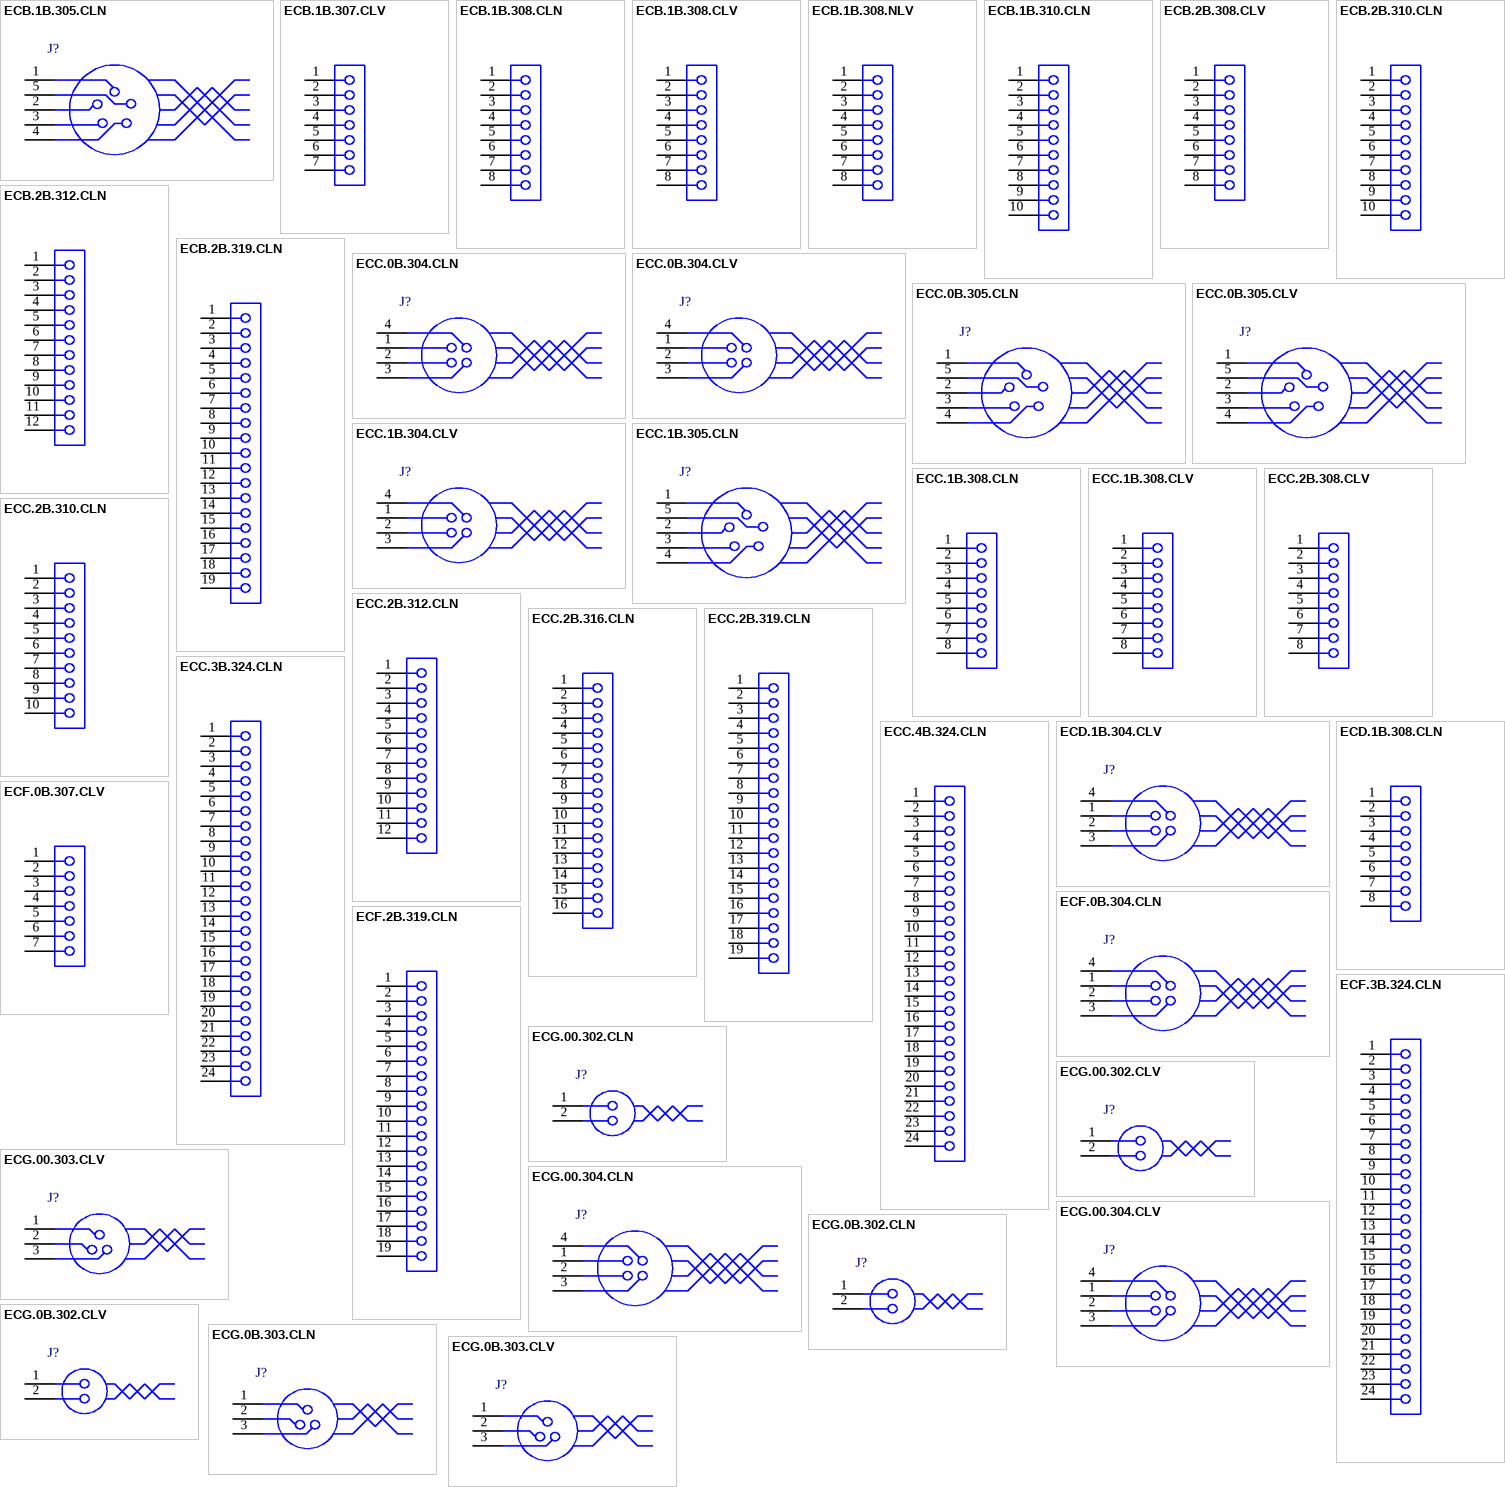
[diagram p1: symbols ECB.1B.305.CLN to ECG.0B.303.CLV]

## ECB.1B.305.CLN
designator J?
Fixed receptacle with two nuts and straight contact for printed circuit (back panel mounting), Key (B), 1B series, Multipole Type with 5 Contacts; Manufacturer: LEMO; PartNumber: ECB.1B.305.CLN; Number of contacts: 5; Contact Diameter: 0.9 mm; AWG: 22; Rated Current(A): 9; DatasheetVersion: Jun-14; PackageReference: ECB.1B.305.CLN; PackageDescription: Fixed receptacle with two nuts and straight contact for printed circuit (back panel mounting), Key(B) for Printed Circuit; Supplier 1: Mouser; Supplier Part Number 1: 736-ECB1B305CLN; Supplier 2: Digi-Key; Supplier Part Number 2: ECB.1B.305.CLN-ND; ComponentLink1Description: Manufacturer URL; ComponentLink1URL: http://www.lemo.com; ComponentLink2Description: Datasheet; ComponentLink2URL: http://intra.lemo.ch/catalog/ROW/UK_English/unipole_multipole.pdf
footprint ECB.1B.305.CLN (Socket, Female, Body 12mm dia. Height 19.8 mm, Through hole)
pins: 1, 2, 3, 4, 5

## ECB.1B.307.CLV
designator J?
Fixed receptacle with two nuts, with elbow contact for printed circuit (back panel mounting), Key (B), 1B series, Multipole Type with 7 Contacts; Manufacturer: LEMO; PartNumber: ECB.1B.307.CLV; Number of contacts: 7; Contact Diameter: 0.7 mm; AWG: 24; Rated Current(A): 6; DatasheetVersion: Jun-14; PackageReference: ECB.1B.307.CLV; PackageDescription: Fixed receptacle with two nuts, with elbow contact for printed circuit (back panel mounting), Key(B) for Printed Circuit; Supplier 1: Mouser; Supplier Part Number 1: 736-ECB1B307CLV; Supplier 2: Digi-Key; Supplier Part Number 2: ECB.1B.307.CLV-ND; ComponentLink1Description: Manufacturer URL; ComponentLink1URL: http://www.lemo.com; ComponentLink2Description: Datasheet; ComponentLink2URL: http://intra.lemo.ch/catalog/ROW/UK_English/unipole_multipole.pdf
footprint ECB.1B.307.CLV (Socket, Female, Body 12mm dia. Height 20.3 mm, Through hole)
pins: 1, 2, 3, 4, 5, 6, 7

## ECB.1B.308.CLN
designator J?
Fixed receptacle with two nuts and straight contact for printed circuit (back panel mounting), Key (B), 1B series, Multipole Type with 8 Contacts; Manufacturer: LEMO; PartNumber: ECB.1B.308.CLN; Number of contacts: 8; Contact Diameter: 0.7 mm; AWG: 24; Rated Current(A): 5; DatasheetVersion: Jun-14; PackageReference: ECB.1B.308.CLN; PackageDescription: Fixed receptacle with two nuts and straight contact for printed circuit (back panel mounting), Key(B) for Printed Circuit; ComponentLink1Description: Manufacturer URL; ComponentLink1URL: http://www.lemo.com; ComponentLink2Description: Datasheet; ComponentLink2URL: http://intra.lemo.ch/catalog/ROW/UK_English/unipole_multipole.pdf
footprint ECB.1B.308.CLN (Socket, Female, Body 12mm dia. Height 19.8 mm, Through hole)
pins: 1, 2, 3, 4, 5, 6, 7, 8

## ECB.1B.308.CLV
designator J?
Fixed receptacle with two nuts, with elbow contact for printed circuit (back panel mounting), Key (B), 1B series, Multipole Type with 8 Contacts; Manufacturer: LEMO; PartNumber: ECB.1B.308.CLV; Number of contacts: 8; Contact Diameter: 0.7 mm; AWG: 24; Rated Current(A): 0; DatasheetVersion: Jun-14; PackageReference: ECB.1B.308.CLV; PackageDescription: Fixed receptacle with two nuts, with elbow contact for printed circuit (back panel mounting), Key(B) for Printed Circuit; ComponentLink1Description: Manufacturer URL; ComponentLink1URL: http://www.lemo.com; ComponentLink2Description: Datasheet; ComponentLink2URL: http://intra.lemo.ch/catalog/ROW/UK_English/unipole_multipole.pdf
footprint ECB.1B.308.CLV (Socket, Female, Body 12mm dia. Height 20.3 mm, Through hole)
pins: 1, 2, 3, 4, 5, 6, 7, 8

## ECB.1B.308.NLV
designator J?
Fixed receptacle with two nuts, with elbow contact for printed circuit (back panel mounting), Key (B), 1B series, Multipole Type with 8 Contacts; Manufacturer: LEMO; PartNumber: ECB.1B.308.NLV; Number of contacts: 8; Contact Diameter: 0.7 mm; AWG: 24; Rated Current(A): 5; DatasheetVersion: Jun-14; PackageReference: ECB.1B.308.NLV; PackageDescription: Fixed receptacle with two nuts, with elbow contact for printed circuit (back panel mounting), Key(B) for Printed Circuit; ComponentLink1Description: Manufacturer URL; ComponentLink1URL: http://www.lemo.com; ComponentLink2Description: Datasheet; ComponentLink2URL: http://intra.lemo.ch/catalog/ROW/UK_English/unipole_multipole.pdf
footprint ECB.1B.308.NLV (Socket, Female, Body 12mm dia. Height 20.3 mm, Through hole)
pins: 1, 2, 3, 4, 5, 6, 7, 8

## ECB.1B.310.CLN
designator J?
Fixed receptacle with two nuts and straight contact for printed circuit (back panel mounting), Key (B), 1B series, Multipole Type with 10 Contacts; Manufacturer: LEMO; PartNumber: ECB.1B.310.CLN; Number of contacts: 10; Contact Diameter: 0.5 mm; AWG: 28; Rated Current(A): 2.5; DatasheetVersion: Jun-14; PackageReference: ECB.1B.310.CLN; PackageDescription: Fixed receptacle with two nuts and straight contact for printed circuit (back panel mounting), Key(B) for Printed Circuit; ComponentLink1Description: Manufacturer URL; ComponentLink1URL: http://www.lemo.com; ComponentLink2Description: Datasheet; ComponentLink2URL: http://intra.lemo.ch/catalog/ROW/UK_English/unipole_multipole.pdf
footprint ECB.1B.310.CLN (Socket, Female, Body 12mm dia. Height 19.8 mm, Through hole)
pins: 1, 2, 3, 4, 5, 6, 7, 8, 9, 10

## ECB.2B.308.CLV
designator J?
Fixed receptacle with two nuts, with elbow contact for printed circuit (back panel mounting), Key (B), 2B series, Multipole Type with 8 Contacts; Manufacturer: LEMO; PartNumber: ECB.2B.308.CLV; Number of contacts: 8; Contact Diameter: 0.9 mm; AWG: 22; Rated Current(A): 6; DatasheetVersion: Jun-14; PackageReference: ECB.2B.308.CLV; PackageDescription: Fixed receptacle with two nuts, with elbow contact for printed circuit (back panel mounting), Key(B) for Printed Circuit; ComponentLink1Description: Manufacturer URL; ComponentLink1URL: http://www.lemo.com; ComponentLink2Description: Datasheet; ComponentLink2URL: http://intra.lemo.ch/catalog/ROW/UK_English/unipole_multipole.pdf
footprint ECB.2B.308.CLV (Socket, Female, Body 15mm dia. Height 22.3 mm, Through hole)
pins: 1, 2, 3, 4, 5, 6, 7, 8

## ECB.2B.310.CLN
designator J?
Fixed receptacle with two nuts and straight contact for printed circuit (back panel mounting), Key (B), 2B series, Multipole Type with 10 Contacts; Manufacturer: LEMO; PartNumber: ECB.2B.310.CLN; Number of contacts: 10; Contact Diameter: 0.9 mm; AWG: 22; Rated Current(A): 8; DatasheetVersion: Jun-14; PackageReference: ECB.2B.310.CLN; PackageDescription: Fixed receptacle with two nuts and straight contact for printed circuit (back panel mounting), Key(B) for Printed Circuit; ComponentLink1Description: Manufacturer URL; ComponentLink1URL: http://www.lemo.com; ComponentLink2Description: Datasheet; ComponentLink2URL: http://intra.lemo.ch/catalog/ROW/UK_English/unipole_multipole.pdf
footprint ECB.2B.310.CLN (Socket, Female, Body 15mm dia. Height 21.8 mm, Through hole)
pins: 1, 2, 3, 4, 5, 6, 7, 8, 9, 10

## ECB.2B.312.CLN
designator J?
Fixed receptacle with two nuts and straight contact for printed circuit (back panel mounting), Key (B), 2B series, Multipole Type with 12 Contacts; Manufacturer: LEMO; PartNumber: ECB.2B.312.CLN; Number of contacts: 12; Contact Diameter: 0.7 mm; AWG: 24; Rated Current(A): 7; DatasheetVersion: Jun-14; PackageReference: ECB.2B.312.CLN; PackageDescription: Fixed receptacle with two nuts and straight contact for printed circuit (back panel mounting), Key(B) for Printed Circuit; ComponentLink1Description: Manufacturer URL; ComponentLink1URL: http://www.lemo.com; ComponentLink2Description: Datasheet; ComponentLink2URL: http://intra.lemo.ch/catalog/ROW/UK_English/unipole_multipole.pdf
footprint ECB.2B.312.CLN (Socket, Female, Body 15mm dia. Height 21.8 mm, Through hole)
pins: 1, 2, 3, 4, 5, 6, 7, 8, 9, 10, 11, 12

## ECB.2B.319.CLN
designator J?
Fixed receptacle with two nuts and straight contact for printed circuit (back panel mounting), Key (B), 2B series, Multipole Type with 19 Contacts; Manufacturer: LEMO; PartNumber: ECB.2B.319.CLN; Number of contacts: 19; Contact Diameter: 0.7 mm; AWG: 24; Rated Current(A): 5; DatasheetVersion: Jun-14; PackageReference: ECB.2B.319.CLN; PackageDescription: Fixed receptacle with two nuts and straight contact for printed circuit (back panel mounting), Key(B) for Printed Circuit; Supplier 1: Mouser; Supplier Part Number 1: 736-ECB2B319CLN; Supplier 2: Digi-Key; Supplier Part Number 2: ECB.2B.319.CLN-ND; ComponentLink1Description: Manufacturer URL; ComponentLink1URL: http://www.lemo.com; ComponentLink2Description: Datasheet; ComponentLink2URL: http://intra.lemo.ch/catalog/ROW/UK_English/unipole_multipole.pdf
footprint ECB.2B.319.CLN (Socket, Female, Body 15mm dia. Height 21.8 mm, Through hole)
pins: 1, 2, 3, 4, 5, 6, 7, 8, 9, 10, 11, 12, 13, 14, 15, 16, 17, 18, 19

## ECC.0B.304.CLN
designator J?
Fixed receptacle with two nuts and straight contact for printed circuit (back panel mounting), Key (C), 0B series, Multipole Type with 4 Contacts; Manufacturer: LEMO; PartNumber: ECC.0B.304.CLN; Number of contacts: 4; Contact Diameter: 0.7 mm; AWG: 24; Rated Current(A): 7; DatasheetVersion: Jun-14; PackageReference: ECC.0B.304.CLN; PackageDescription: Fixed receptacle with two nuts and straight contact for printed circuit (back panel mounting), Key(C) for Printed Circuit; ComponentLink1Description: Manufacturer URL; ComponentLink1URL: http://www.lemo.com; ComponentLink2Description: Datasheet; ComponentLink2URL: http://intra.lemo.ch/catalog/ROW/UK_English/unipole_multipole.pdf
footprint ECC.0B.304.CLN (Socket, Female, Body 9mm dia. Height 16.4 mm, Through hole)
pins: 1, 2, 3, 4
